# Altium footprint library HW_Dron_V2.PcbLib: 55 footprints (part 3 of 4)
Each footprint in its own frame and in the unit in brackets; x right, y up, seen from the top. Pads: shape width x height; smd on the part's side, far side on the other; paste and mask are expansions set on the pad; w line width, h text height; cw(c..) or ccw(c..) is an arc to the next point about the centre after c.
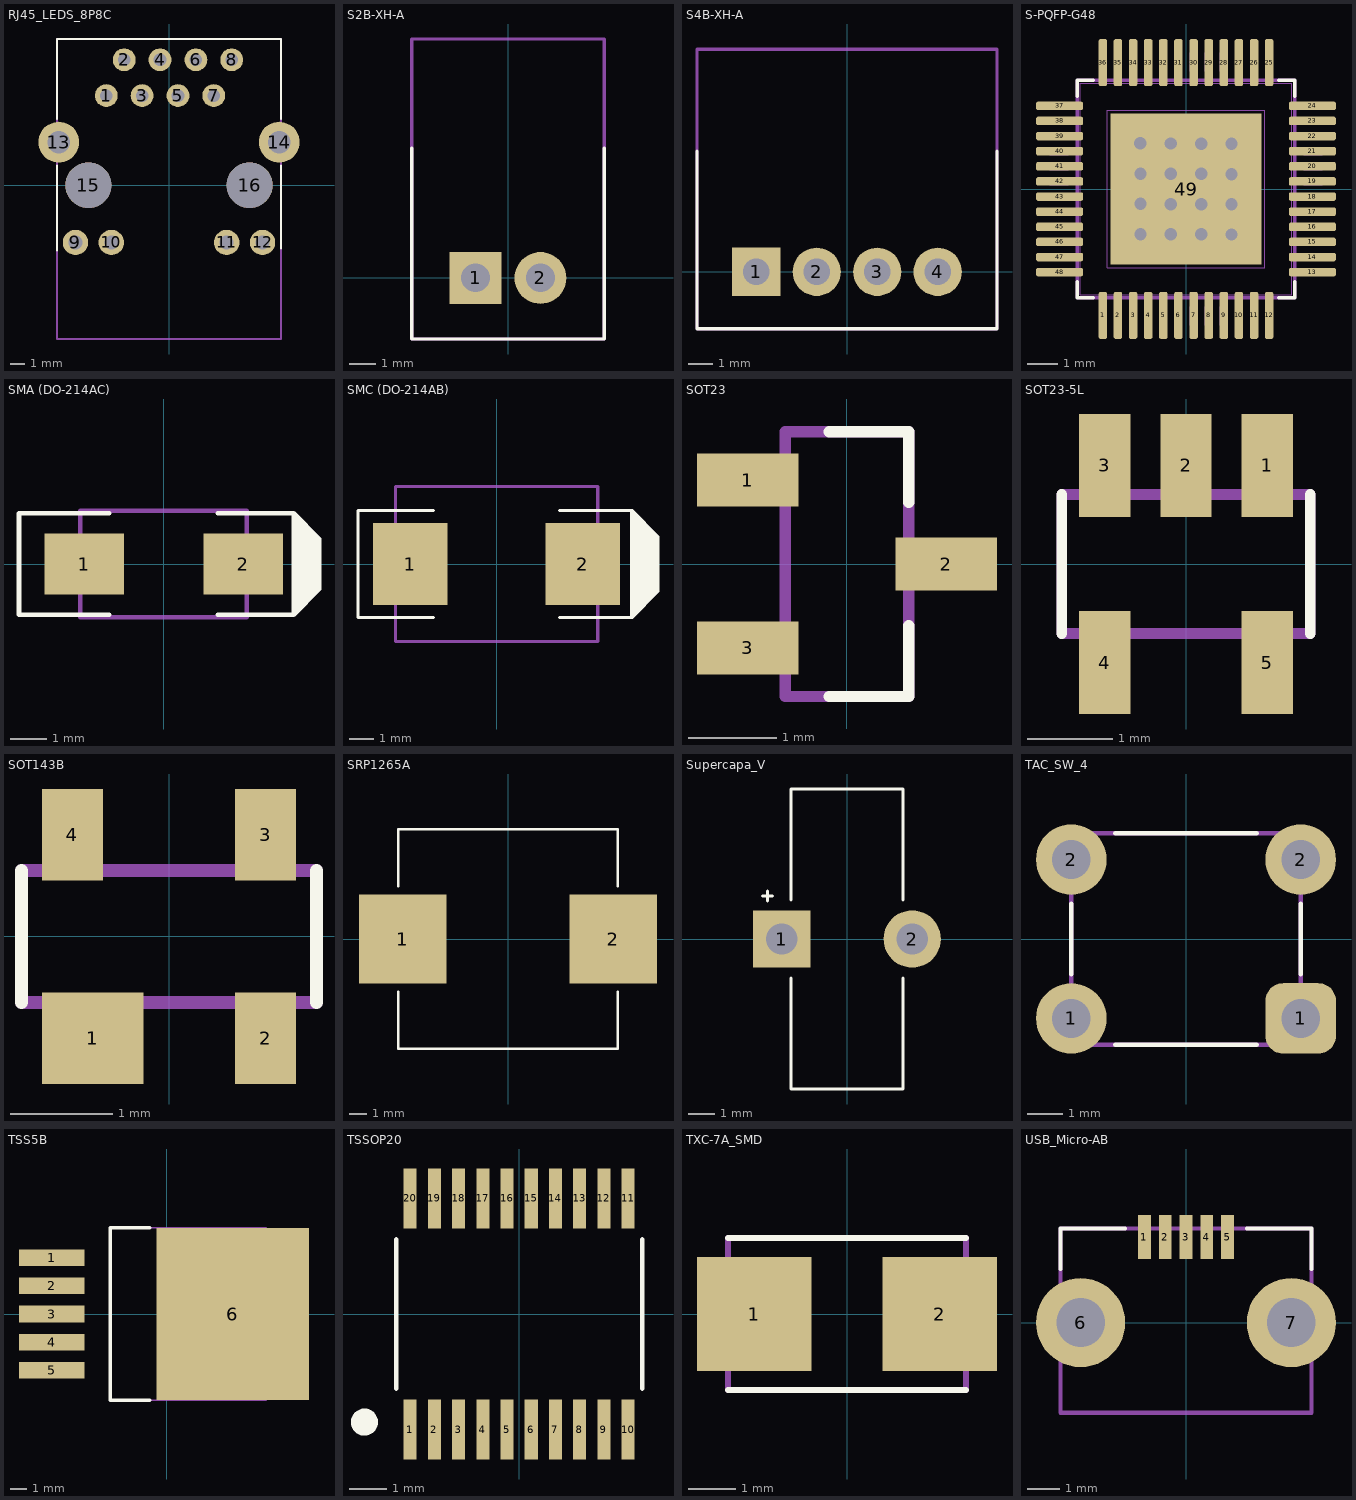
[diagram p2: the footprints below, top view; thin cyan lines are the x and y axes]

## RJ45_LEDS_8P8C [mm]
pads (16):
  round 1.62 hole 0.9: 1(-4.445,6.35) 2(-3.175,8.89) 3(-1.905,6.35) 4(-0.635,8.89) 5(0.635,6.35) 6(1.905,8.89) 7(3.175,6.35) 8(4.445,8.89)
  round 1.8 hole 1: 9(-6.63,-4.06) 10(-4.09,-4.06) 11(4.09,-4.06) 12(6.63,-4.06)
  round 2.9 hole 1.6: 13(-7.815,3.05) 14(7.815,3.05)
  round 3.25 hole 3.25 unplated: 15(-5.715,0) 16(5.715,0)
Top Overlay:
  lines w0.127: -7.94,-4.633 -7.94,1.4 ; -7.94,4.7 -7.94,10.365 7.94,10.365 7.94,4.7 ; 7.94,-4.506 7.94,1.4
Mechanical 13:
  lines w0.127: -7.94,-10.905 7.94,-10.905 7.94,10.365 -7.94,10.365 -7.94,-10.905
3D body: height 3.55, standoff -14.15, extent -8,-11.049 8,10.351

## S2B-XH-A [mm] "Conector JST XH A side 2 pos"
height 6.1
pads (2):
  rect 2x2 hole 1.1: 1(-1.25,0)
  round 2 hole 1.1: 2(1.25,0)
Top Overlay:
  lines w0.127: -3.7,5 -3.7,-2.35 3.7,-2.35 3.7,5
Mechanical 13:
  lines w0.127: -3.7,-2.35 -3.7,9.2 3.7,9.2 3.7,-2.35 -3.7,-2.35
3D body: height 6.1, standoff -2, extent -3.7,-2.25 3.7,9.25

## S4B-XH-A [mm] "Conector JST XH A side 4 pos"
height 6.1
pads (4):
  rect 2x2 hole 1.1: 1(-3.75,0)
  round 2 hole 1.1: 2(-1.25,0) 3(1.25,0) 4(3.75,0)
Top Overlay:
  lines w0.127: -6.2,5 -6.2,-2.35 6.2,-2.35 6.2,5
Mechanical 13:
  lines w0.127: -6.2,-2.35 6.2,-2.35 6.2,9.2 -6.2,9.2 -6.2,-2.35
3D body: height 6.1, standoff -2, extent -6.25,-2.25 6.15,9.25

## S-PQFP-G48 [mm] "PowerPAD Plastic Quad Flatpack"
height 1.2
pads (49):
  rrect50% 0.28x1.56 smd: 1(-2.75,-4.18) 2(-2.25,-4.18) 3(-1.75,-4.18) 4(-1.25,-4.18) 5(-0.75,-4.18) 6(-0.25,-4.18) 7(0.25,-4.18) 8(0.75,-4.18) 9(1.25,-4.18) 10(1.75,-4.18) 11(2.25,-4.18) 12(2.75,-4.18) 25(2.75,4.18) 26(2.25,4.18) 27(1.75,4.18) 28(1.25,4.18) 29(0.75,4.18) 30(0.25,4.18) 31(-0.25,4.18) 32(-0.75,4.18) 33(-1.25,4.18) 34(-1.75,4.18) 35(-2.25,4.18) 36(-2.75,4.18)
  rrect50% 1.56x0.28 smd: 13(4.18,-2.75) 14(4.18,-2.25) 15(4.18,-1.75) 16(4.18,-1.25) 17(4.18,-0.75) 18(4.18,-0.25) 19(4.18,0.25) 20(4.18,0.75) 21(4.18,1.25) 22(4.18,1.75) 23(4.18,2.25) 24(4.18,2.75) 37(-4.18,2.75) 38(-4.18,2.25) 39(-4.18,1.75) 40(-4.18,1.25) 41(-4.18,0.75) 42(-4.18,0.25) 43(-4.18,-0.25) 44(-4.18,-0.75) 45(-4.18,-1.25) 46(-4.18,-1.75) 47(-4.18,-2.25) 48(-4.18,-2.75)
  rect 5x5 smd mask+0: 49(0,0)
via -1.508,0.508 diameter 0.711 hole 0.406
via -1.508,-0.492 diameter 0.711 hole 0.406
via -1.516,1.516 diameter 0.711 hole 0.406
via -1.508,-1.492 diameter 0.711 hole 0.406
via 1.508,0.492 diameter 0.711 hole 0.406
via 1.508,-0.508 diameter 0.711 hole 0.406
via 1.508,1.492 diameter 0.711 hole 0.406
via 1.508,-1.508 diameter 0.711 hole 0.406
via 0.5,-1.5 diameter 0.711 hole 0.406
via -0.5,-1.5 diameter 0.711 hole 0.406
via -0.508,1.508 diameter 0.711 hole 0.406
via 0.5,1.5 diameter 0.711 hole 0.406
via 0.5,-0.5 diameter 0.711 hole 0.406
via 0.5,0.5 diameter 0.711 hole 0.406
via -0.5,-0.5 diameter 0.711 hole 0.406
via -0.5,0.5 diameter 0.711 hole 0.406
Top Overlay:
  lines w0.12: -3.6,-3.07 -3.6,-3.6 -3.07,-3.6 ; -3.6,3.07 -3.6,3.6 -3.07,3.6 ; 3.07,-3.6 3.6,-3.6 3.6,-3.07 ; 3.07,3.6 3.6,3.6 3.6,3.07
  text "." at -3.429,-4.318 h0.76
Mechanical 12:
  drawing of 200 lines, arcs and shapes, not listed
Mechanical 13:
  lines w0.12: -3.6,-3.6 3.6,-3.6 3.6,3.6 -3.6,3.6 -3.6,-3.6
Mechanical 15:
  circle w0.05: c0,0 r0.25
  lines w0.05: -0.35,0 0.35,0 ; 0,-0.35 0,0.35
3D body: height -0.4, standoff -1.9, extent -4.5,-4.5 4.5,4.5

## SMA (DO-214AC) [mm]
height 3
pads (2):
  rect 2.2x1.7 smd: 1(-2.2,0) 2(2.2,0)
Top Overlay:
  region: 3.6,1.4 4.3,0.7 4.3,-0.7 3.6,-1.4
  lines w0.127: -1.5,-1.4 -4,-1.4 -4,1.4 -1.5,1.4 ; 1.5,-1.4 3.6,-1.4 ; 1.5,1.4 3.6,1.4 ; 3.6,-1.4 3.6,1.4 ; 3.6,-1.4 4.3,-0.7 4.3,0.7 3.6,1.4
Mechanical 13:
  lines w0.127: -2.3,-1.475 -2.3,1.475 2.3,1.475 2.3,-1.475 -2.3,-1.475
3D body: height 2.24, standoff -0.04, extent -2.743,-1.397 2.743,1.397

## SMC (DO-214AB) [mm]
pads (2):
  rect 3x3.3 smd: 1(-3.475,0) 2(3.475,0)
Top Overlay:
  region: 5.441,2.159 6.5,1.1 6.5,-1.1 5.441,-2.159
  lines w0.127: -2.54,-2.159 -5.588,-2.159 -5.588,2.159 -2.54,2.159 ; 2.54,-2.159 5.441,-2.159 ; 2.54,2.159 5.441,2.159 ; 5.441,-2.159 5.441,2.159 ; 5.441,-2.159 6.5,-1.1 6.5,1.1 5.441,2.159
Mechanical 13:
  lines w0.127: -4.075,-3.125 -4.075,3.125 4.075,3.125 4.075,-3.125 -4.075,-3.125
3D body: height -0.43, standoff -3.07, extent -4.065,-3.15 4.063,3.149

## SOT23 [mm]
height 1
pads (3):
  rect 1.15x0.6 smd: 1(-1.125,0.95) 2(1.125,0) 3(-1.125,-0.95)
Top Overlay:
  lines w0.127: -0.2,-1.5 0.7,-1.5 0.7,-0.7 ; -0.2,1.5 0.7,1.5 0.7,0.7
Mechanical 13:
  lines w0.127: -0.7,-1.5 0.7,-1.5 0.7,1.5 -0.7,1.5 -0.7,-1.5
3D body: height 1.09, standoff -0.01, extent -1.27,-1.5 1.23,1.5

## SOT23-5L [mm]
height 1.2
pads (5):
  rect 0.6x1.2 smd: 1(0.95,1.15) 2(0,1.15) 3(-0.95,1.15) 4(-0.95,-1.15) 5(0.95,-1.15)
Top Overlay:
  lines w0.127: -1.45,-0.813 -1.45,0.813 ; 1.45,-0.813 1.45,0.813
Mechanical 13:
  lines w0.127: -1.45,-0.813 -1.45,0.813 1.45,0.813 1.45,-0.813 -1.45,-0.813
3D body: height 1.06, standoff -0.04, extent -1.5,-1.25 1.5,1.25

## SOT143B [mm]
pads (4):
  rect 1x0.9 smd: 1(-0.75,-1)
  rect 0.6x0.9 smd: 2(0.95,-1) 3(0.95,1) 4(-0.95,1)
Top Overlay:
  lines w0.127: -1.45,-0.65 -1.45,0.65 ; 1.45,-0.65 1.45,0.65
Mechanical 13:
  lines w0.127: -1.45,-0.65 -1.45,0.65 1.45,0.65 1.45,-0.65 -1.45,-0.65
3D body: height 1, standoff 0, extent -1.46,-1.21 1.46,1.21

## SRP1265A [mm] "Shielded Power Inductors"
height 6.4
pads (2):
  rect 5x5.1 smd: 1(-6,0) 2(6,0)
Top Overlay:
  lines w0.127: -6.25,-3 -6.25,-6.25 6.25,-6.25 6.25,-3 ; -6.25,3 -6.25,6.25 6.25,6.25 6.25,3
3D body: height 6.4, standoff 0, extent -6.75,-6.25 6.75,6.25

## Supercapa_V [mm] "Supercapacitor vertical cilindrico"
pads (2):
  rect 2.2x2.2 hole 1.2: 1(-2.5,0)
  round 2.2 hole 1.2: 2(2.5,0)
Top Overlay:
  lines w0.127: -3.238,1.651 -3.048,1.651 -2.857,1.651 ; -3.048,1.46 -3.048,1.841 ; -2.15,-1.5 -2.15,-5.75 2.15,-5.75 2.15,-1.5 ; -2.15,1.5 -2.15,5.75 2.15,5.75 2.15,1.5
3D body: height 1.81, standoff 0.18, extent -2.527,-2.147 2.273,2.654

## TAC_SW_4 [mm] "TAC SWITCH de 4"
pads (4):
  round 2 hole 1.1: 1(-3.25,-2.25) 2(-3.25,2.25) 2(3.25,2.25)
  rrect50% 2x2 hole 1.1: 1(3.25,-2.25)
Top Overlay:
  lines w0.127: -3.25,-1 -3.25,1 ; -2,-3 2,-3 ; -2,3 2,3 ; 3.25,-1 3.25,1
Mechanical 13:
  lines w0.127: -3.25,-3 3.25,-3 3.25,3 -3.25,3 -3.25,-3
3D body: height 5.01, standoff -3.51, extent -3.871,-3.015 3.872,3.015

## TSS5B [mm] "Encapsulado SMD TO-263-5"
height 4.57
pads (6):
  rect 3.96x1 smd: 1(-6.93,3.4) 2(-6.93,1.7) 3(-6.93,0) 4(-6.93,-1.7) 5(-6.93,-3.4)
  rect 9.2x10.4 smd: 6(4,0)
Top Overlay:
  lines w0.2: -1,-5.2 -3.4,-5.2 -3.4,5.2 -1,5.2
Mechanical 13:
  lines w0.1: -3.4,-5.2 -3.4,5.2 6,5.2 6,-5.2 -3.4,-5.2
Mechanical 15:
  lines w0.1: -0.5,0 0.5,0 ; 0,-0.5 0,0.5
3D body: height 4.87, standoff 0, extent -7.751,-5.08 6.479,5.08

## TSSOP20 [mm] "20-Lead Plastic TSSOP"
height 1.2
pads (20):
  rect 0.35x1.6 smd: 1(-2.925,-3.1) 2(-2.275,-3.1) 3(-1.625,-3.1) 4(-0.975,-3.1) 5(-0.325,-3.1) 6(0.325,-3.1) 7(0.975,-3.1) 8(1.625,-3.1) 9(2.275,-3.1) 10(2.925,-3.1) 11(2.925,3.1) 12(2.275,3.1) 13(1.625,3.1) 14(0.975,3.1) 15(0.325,3.1) 16(-0.325,3.1) 17(-0.975,3.1) 18(-1.625,3.1) 19(-2.275,3.1) 20(-2.925,3.1)
Top Overlay:
  circle w0.381: c-4.151,-2.901 r0.173
  lines w0.127: -3.3,-2 -3.3,2 ; 3.3,-2 3.3,2
3D body: height 1.2, standoff 0, extent -3.3,-3.3 3.3,3.3

## TXC-7A_SMD [mm] "5 x 3.2 mm SMD Glass Crystal 7A Series"
height 1.2
pads (2):
  rect 2.4x2.4 smd: 1(-1.95,0) 2(1.95,0)
Top Overlay:
  lines w0.127: -2.5,-1.6 2.5,-1.6 ; -2.5,1.6 2.5,1.6
Mechanical 13:
  lines w0.127: -2.5,-1.6 2.5,-1.6 2.5,1.6 -2.5,1.6 -2.5,-1.6
3D body: height 1.25, standoff 0, extent -2.5,-1.6 2.5,1.6

## USB_Micro-AB [mil]
pads (7):
  rect 16x54 smd: 1(-51.18,105.31) 2(-25.59,105.31) 3(0,105.31) 4(25.59,105.31) 5(51.18,105.31)
  round 110 hole 60: 6(-129.92,0) 7(129.92,0)
Top Overlay:
  lines w5: -154.72,66.06 -154.72,116.14 -75.16,116.14 ; 75.16,116.14 154.72,116.14 154.72,66.06
Mechanical 13:
  lines w5: -154.72,115.16 -154.72,-111.22 154.72,-111.22 154.72,115.16 ; -154.72,116.14 154.72,116.14
3D body: height 110.24, standoff -30.32, extent -157.48,-105.48 157.48,115